# Altium footprint library LUMI_Handy_Soldering_LIB.PcbLib: 562 footprints (part 6 of 36)
Each footprint in its own frame and in the unit in brackets; x right, y up, seen from the top. Pads: shape width x height; smd on the part's side, far side on the other; paste and mask are expansions set on the pad; w line width, h text height; cw(c..) or ccw(c..) is an arc to the next point about the centre after c.
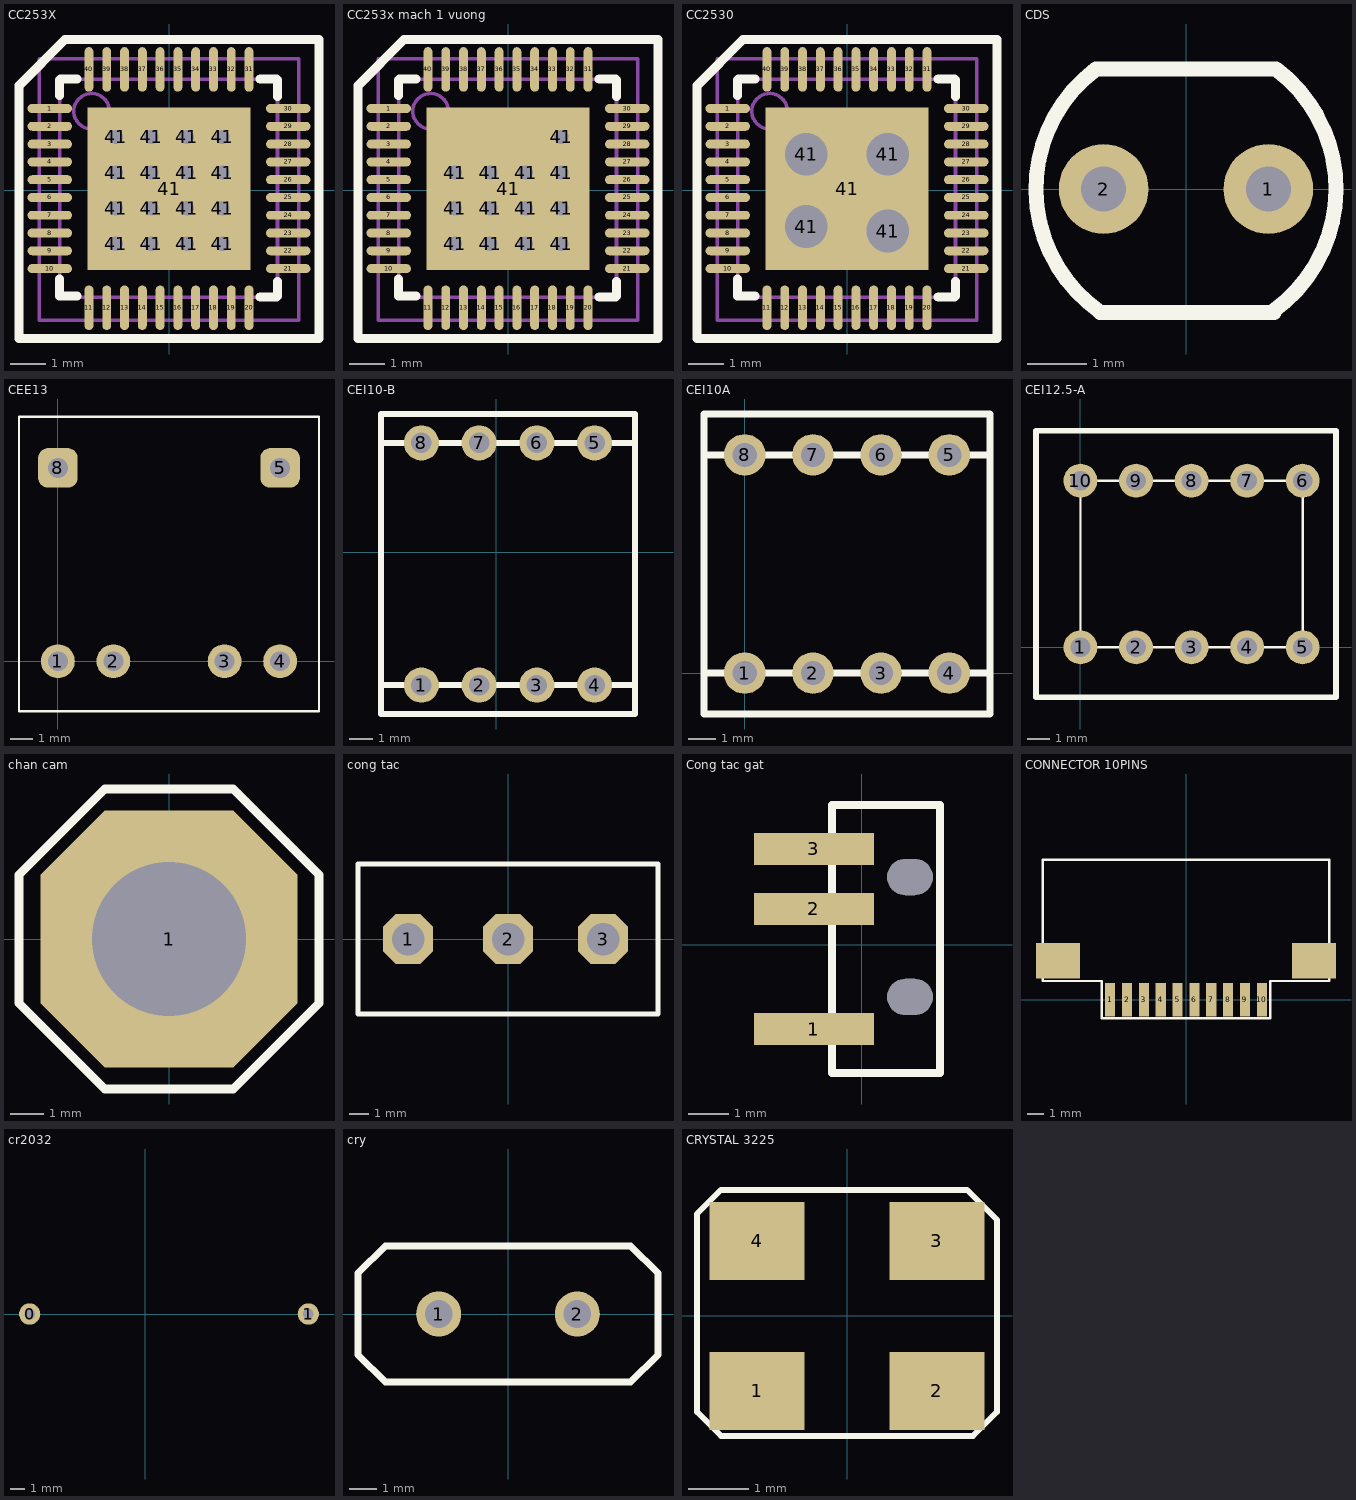
[diagram p5: the footprints below, top view; thin cyan lines are the x and y axes]

## CC253X [mm]
pads (57):
  oval 1.25x0.25 smd: 1(-3.35,2.3) 2(-3.35,1.8) 3(-3.35,1.3) 4(-3.35,0.8) 5(-3.35,0.3) 6(-3.35,-0.2) 7(-3.35,-0.7) 8(-3.35,-1.2) 9(-3.35,-1.7) 10(-3.35,-2.2) 21(3.35,-2.2) 22(3.35,-1.7) 23(3.35,-1.2) 24(3.35,-0.7) 25(3.35,-0.2) 26(3.35,0.3) 27(3.35,0.8) 28(3.35,1.3) 29(3.35,1.8) 30(3.35,2.3)
  oval 0.25x1.25 smd: 11(-2.25,-3.3) 12(-1.75,-3.3) 13(-1.25,-3.3) 14(-0.75,-3.3) 15(-0.25,-3.3) 16(0.25,-3.3) 17(0.75,-3.3) 18(1.25,-3.3) 19(1.75,-3.3) 20(2.25,-3.3) 31(2.25,3.4) 32(1.75,3.4) 33(1.25,3.4) 34(0.75,3.4) 35(0.25,3.4) 36(-0.25,3.4) 37(-0.75,3.4) 38(-1.25,3.4) 39(-1.75,3.4) 40(-2.25,3.4)
  round 0.8 hole 0.4: 41(-1.5,-1.5) 41(-1.5,-0.5) 41(-1.5,0.5) 41(-1.5,1.5) 41(-0.5,-1.5) 41(-0.5,-0.5) 41(-0.5,0.5) 41(-0.5,1.5) 41(0.5,-1.5) 41(0.5,-0.5) 41(0.5,0.5) 41(0.5,1.5) 41(1.5,-1.5) 41(1.5,-0.5) 41(1.5,0.5) 41(1.5,1.5)
  rect 4.572x4.572 smd: 41(0,0.05)
Top Overlay:
  lines w0.254: -3.073,-2.489 -3.073,-2.972 -2.591,-2.972 ; -3.073,2.667 -3.073,3.099 -3.048,3.124 -2.591,3.124 ; 2.565,-2.997 3.023,-2.997 3.048,-2.972 3.048,-2.565 ; 2.565,3.124 3.023,3.124 3.048,3.099 3.048,2.642 ; -4.216,-4.166 4.216,-4.166 4.216,4.242 -2.921,4.242 -4.216,2.946 -4.216,-4.166
Mechanical 13:
  circle w0.1: c-2.175,2.225 r0.5
  lines w0.1: -3.075,-3 3.05,-3 3.05,3.125 -3.075,3.125 -3.075,-3
Mechanical 15:
  lines w0.1: 0,-0.45 1,-0.45 ; 0.5,-0.95 0.5,0.05 ; -3.65,-3.65 3.65,-3.65 3.65,3.7 -3.65,3.7 -3.65,-3.65
3D body: height 1.04, standoff -0.01, extent -3.075,-3.025 3.075,3.125

## CC253x mach 1 vuong [mm]
pads (54):
  oval 1.25x0.25 smd: 1(-3.35,2.3) 2(-3.35,1.8) 3(-3.35,1.3) 4(-3.35,0.8) 5(-3.35,0.3) 6(-3.35,-0.2) 7(-3.35,-0.7) 8(-3.35,-1.2) 9(-3.35,-1.7) 10(-3.35,-2.2) 21(3.35,-2.2) 22(3.35,-1.7) 23(3.35,-1.2) 24(3.35,-0.7) 25(3.35,-0.2) 26(3.35,0.3) 27(3.35,0.8) 28(3.35,1.3) 29(3.35,1.8) 30(3.35,2.3)
  oval 0.25x1.25 smd: 11(-2.25,-3.3) 12(-1.75,-3.3) 13(-1.25,-3.3) 14(-0.75,-3.3) 15(-0.25,-3.3) 16(0.25,-3.3) 17(0.75,-3.3) 18(1.25,-3.3) 19(1.75,-3.3) 20(2.25,-3.3) 31(2.25,3.4) 32(1.75,3.4) 33(1.25,3.4) 34(0.75,3.4) 35(0.25,3.4) 36(-0.25,3.4) 37(-0.75,3.4) 38(-1.25,3.4) 39(-1.75,3.4) 40(-2.25,3.4)
  round 0.8 hole 0.4: 41(-1.5,-1.5) 41(-1.5,-0.5) 41(-1.5,0.5) 41(-0.5,-1.5) 41(-0.5,-0.5) 41(-0.5,0.5) 41(0.5,-1.5) 41(0.5,-0.5) 41(0.5,0.5) 41(1.5,-1.5) 41(1.5,-0.5) 41(1.5,0.5) 41(1.5,1.5)
  rect 4.572x4.572 smd: 41(0,0.05)
Top Overlay:
  lines w0.254: -3.073,-2.489 -3.073,-2.972 -2.591,-2.972 ; -3.073,2.667 -3.073,3.099 -3.048,3.124 -2.591,3.124 ; 2.565,-2.997 3.023,-2.997 3.048,-2.972 3.048,-2.565 ; 2.565,3.124 3.023,3.124 3.048,3.099 3.048,2.642 ; -4.216,-4.166 -4.216,2.946 -2.921,4.242 4.216,4.242 4.216,-4.166 -4.216,-4.166
Mechanical 13:
  circle w0.1: c-2.175,2.225 r0.5
  lines w0.1: -3.075,-3 -3.075,3.125 3.05,3.125 3.05,-3 -3.075,-3
Mechanical 15:
  lines w0.1: 0,-0.45 1,-0.45 ; 0.5,-0.95 0.5,0.05 ; -3.65,-3.65 -3.65,3.7 3.65,3.7 3.65,-3.65 -3.65,-3.65
3D body: height 1.04, standoff -0.01, extent -3.075,-3.025 3.075,3.125

## CC2530 [mm]
pads (45):
  oval 1.25x0.25 smd: 1(-3.35,2.3) 2(-3.35,1.8) 3(-3.35,1.3) 4(-3.35,0.8) 5(-3.35,0.3) 6(-3.35,-0.2) 7(-3.35,-0.7) 8(-3.35,-1.2) 9(-3.35,-1.7) 10(-3.35,-2.2) 21(3.35,-2.2) 22(3.35,-1.7) 23(3.35,-1.2) 24(3.35,-0.7) 25(3.35,-0.2) 26(3.35,0.3) 27(3.35,0.8) 28(3.35,1.3) 29(3.35,1.8) 30(3.35,2.3)
  oval 0.25x1.25 smd: 11(-2.25,-3.3) 12(-1.75,-3.3) 13(-1.25,-3.3) 14(-0.75,-3.3) 15(-0.25,-3.3) 16(0.25,-3.3) 17(0.75,-3.3) 18(1.25,-3.3) 19(1.75,-3.3) 20(2.25,-3.3) 31(2.25,3.4) 32(1.75,3.4) 33(1.25,3.4) 34(0.75,3.4) 35(0.25,3.4) 36(-0.25,3.4) 37(-0.75,3.4) 38(-1.25,3.4) 39(-1.75,3.4) 40(-2.25,3.4)
  round 1.6 hole 1.2: 41(-1.143,-1.016) 41(-1.143,1.016) 41(1.143,-1.143) 41(1.143,1.016)
  rect 4.572x4.572 smd: 41(0,0.05)
Top Overlay:
  lines w0.254: -3.073,-2.489 -3.073,-2.972 -2.591,-2.972 ; -3.073,2.667 -3.073,3.099 -3.048,3.124 -2.591,3.124 ; 2.565,-2.997 3.023,-2.997 3.048,-2.972 3.048,-2.565 ; 2.565,3.124 3.023,3.124 3.048,3.099 3.048,2.642 ; -4.216,-4.166 -4.216,2.946 -2.921,4.242 4.216,4.242 4.216,-4.166 -4.216,-4.166
Mechanical 13:
  circle w0.1: c-2.175,2.225 r0.5
  lines w0.1: -3.075,-3 -3.075,3.125 3.05,3.125 3.05,-3 -3.075,-3
Mechanical 15:
  lines w0.1: 0,-0.45 1,-0.45 ; 0.5,-0.95 0.5,0.05 ; -3.65,-3.65 -3.65,3.7 3.65,3.7 3.65,-3.65 -3.65,-3.65
3D body: height 1.04, standoff -0.01, extent -3.075,-3.025 3.075,3.125

## CDS [mil]
pads (2):
  round 60 hole 30: 1(55.12,0) 2(-55.12,0)
Top Overlay:
  lines w10: -57.56,-82.79 59.06,-82.79 ; -57.56,-82.23 cw(c0,0) -60.22,80.3 60.22,80.3 cw(c0,0) 58.29,-81.71
3D body: height 160, standoff -1330, extent -91,-75.26 91,78.74

## CEE13 [mil]
height 413.39
pads (6):
  round 60 hole 35: 1(0,0) 2(98.43,0) 3(295.28,0) 4(393.7,0)
  rrect50% 70x70 hole 35: 5(393.7,342.52) 8(0,342.52)
Top Overlay:
  lines w4: -68.9,-88.58 462.6,-88.58 462.6,433.07 -68.9,433.07 -68.9,-88.58
3D body: height 413.39, standoff 1, extent -196.85,-275.59 236.22,236.22
3D body: height 472.44, standoff 10, extent -68.9,-88.58 462.6,433.07
3D body: height 196.85, standoff -196.85, extent 378.82,-14.96 408.7,14.98
3D body: height 196.85, standoff -196.85, extent 280.4,-14.96 310.28,14.98
3D body: height 196.85, standoff -196.85, extent 83.55,-14.96 113.43,14.98
3D body: height 196.85, standoff -196.85, extent -14.88,-14.96 15,14.98
3D body: height 196.85, standoff -196.85, extent -14.88,327.56 15,357.5
3D body: height 196.85, standoff -196.85, extent 378.82,327.56 408.7,357.5

## CEI10-B [mil]
height 413.39
pads (8):
  round 60 hole 35: 1(-127.95,-226.38) 2(-29.53,-226.38) 3(68.9,-226.38) 4(167.32,-226.38) 5(167.32,187.01) 6(68.9,187.01) 7(-29.53,187.01) 8(-127.95,187.01)
Top Overlay:
  lines w10: -196.85,-226.38 236.22,-226.38 ; -196.85,187.01 236.22,187.01 ; -196.85,-275.59 -196.85,236.22 236.22,236.22 236.22,-275.59 -196.85,-275.59
3D body: height 413.39, standoff 1, extent -196.85,-275.59 236.22,236.22
3D body: height 413.39, standoff 10, extent -196.85,-275.59 236.22,236.22
3D body: height 196.85, standoff -196.85, extent -142.83,172.04 -112.95,201.98
3D body: height 196.85, standoff -196.85, extent -44.4,172.04 -14.52,201.98
3D body: height 196.85, standoff -196.85, extent 54.02,172.04 83.9,201.98
3D body: height 196.85, standoff -196.85, extent 152.45,172.04 182.33,201.98
3D body: height 196.85, standoff -196.85, extent -142.83,-241.34 -112.95,-211.4
3D body: height 196.85, standoff -196.85, extent -44.4,-241.34 -14.52,-211.4
3D body: height 196.85, standoff -196.85, extent 54.02,-241.34 83.9,-211.4
3D body: height 196.85, standoff -196.85, extent 152.45,-241.34 182.33,-211.4

## CEI10A [mil]
height 413.39
pads (8):
  round 60 hole 35: 1(0,0) 2(98.43,0) 3(196.85,0) 4(295.28,0) 5(295.28,314.96) 6(196.85,314.96) 7(98.43,314.96) 8(0,314.96)
Top Overlay:
  lines w10: -59.06,0 354.33,0 ; -59.06,314.96 354.33,314.96 ; -59.06,-59.06 354.33,-59.06 354.33,374.02 -59.06,374.02 -59.06,-59.06
3D body: height 196.85, standoff -196.85, extent 280.4,-14.96 310.28,14.97
3D body: height 196.85, standoff -196.85, extent 181.97,-14.96 211.85,14.97
3D body: height 196.85, standoff -196.85, extent 83.55,-14.96 113.43,14.97
3D body: height 196.85, standoff -196.85, extent -14.88,-14.96 15,14.97
3D body: height 196.85, standoff -196.85, extent 280.4,300 310.28,329.93
3D body: height 196.85, standoff -196.85, extent 181.97,300 211.86,329.94
3D body: height 196.85, standoff -196.85, extent 83.55,300 113.43,329.94
3D body: height 196.85, standoff -196.85, extent -14.88,300 15,329.94
3D body: height 433.07, standoff 7.87, extent -59.06,-59.06 354.33,374.02
3D body: height 413.39, standoff 1, extent -196.85,-275.59 236.22,236.22

## CEI12.5-A [mil]
height 413.39
pads (10):
  round 60 hole 35: 1(0,0) 2(98.43,0) 3(196.85,0) 4(295.28,0) 5(393.7,0) 6(393.7,295.28) 7(295.28,295.28) 8(196.85,295.28) 9(98.43,295.28) 10(0,295.28)
Top Overlay:
  lines w4: 0,0 393.7,0 393.7,295.28 0,295.28 0,0
  lines w10: -78.74,-88.58 -78.74,383.86 452.76,383.86 452.76,-88.58 -78.74,-88.58
3D body: height 413.39, standoff 1, extent -196.85,-275.59 236.22,236.22
3D body: height 413.39, standoff 10, extent -78.74,-88.58 452.76,383.86
3D body: height 196.85, standoff -196.85, extent -14.88,280.31 15,310.25
3D body: height 196.85, standoff -196.85, extent 83.55,280.31 113.43,310.25
3D body: height 196.85, standoff -196.85, extent 181.97,280.31 211.85,310.25
3D body: height 196.85, standoff -196.85, extent 280.4,280.31 310.28,310.25
3D body: height 196.85, standoff -196.85, extent 378.82,280.31 408.7,310.25
3D body: height 196.85, standoff -196.85, extent 378.82,-14.96 408.7,14.98
3D body: height 196.85, standoff -196.85, extent 280.4,-14.96 310.28,14.98
3D body: height 196.85, standoff -196.85, extent 181.97,-14.96 211.85,14.98
3D body: height 196.85, standoff -196.85, extent 83.55,-14.96 113.43,14.98
3D body: height 196.85, standoff -196.85, extent -14.88,-14.96 15,14.98

## chan cam [mil]
pads (1):
  oct 300x300 hole 180: 1(0,0)
Top Overlay:
  lines w10: -175,-75 -75,-175 75,-175 175,-75 175,75 75,175 -75,175 -175,75 -175,-75

## CHAN CAM 2 [mm]

## cong tac [mil]
pads (3):
  oct 100x100 hole 65: 1(-200,0) 2(0,0) 3(190,0)
Top Overlay:
  lines w10: -300,-150 300,-150 300,150 -300,150 -300,-150

## Cong tac gat [mm]
pads (5):
  rect 3x0.8 smd: 1(-1.2,-2.1) 2(-1.2,0.9) 3(-1.2,2.4)
  round 0 hole 0.9 slot 1.143 at 0 deg: ""(1.2,-1.3) ""(1.2,1.7)
Top Overlay:
  lines w0.2: -0.75,-3.2 -0.75,3.5 1.95,3.5 1.95,-3.2 -0.75,-3.2

## CONNECTOR 10PINS [mm] "Dung noi mach cam ung va mach cong suat"
pads (12):
  rect 0.6x2 smd: 1(-4.5,0) 2(-3.5,0) 3(-2.5,0) 4(-1.5,0) 5(-0.5,0) 6(0.5,0) 7(1.5,0) 8(2.5,0) 9(3.5,0) 10(4.5,0)
  rect 2.6x2.1 smd: ""(-7.6,2.3) ""(7.6,2.3)
Top Overlay:
  lines w0.127: -8.5,1.1 -5,1.1 -5,-1.1 5,-1.1 5,1.1 8.5,1.1 8.5,8.3 -8.5,8.3 -8.5,1.1
3D body: height 3, standoff 0, extent -8.5,-0.5 8.5,8.2

## cr2032 [mil]
pads (2):
  round 60 hole 30: 0(-325,0) 1(460,0)
3D body: height 307.94, standoff -111.35, extent -432.93,-444.07 492.27,445.69

## cry [mil]
pads (2):
  round 65 hole 40: 1(-100,0) 2(100,0)
Top Overlay:
  lines w10: -216.54,-59.06 -216.54,59.06 -177.17,98.43 177.17,98.43 216.54,59.06 216.54,-59.06 177.17,-98.43 -177.17,-98.43 -216.54,-59.06
3D body: height 145.67, standoff -149.61, extent -223.43,-93.07 223.43,90

## CRYSTAL 3225 [mm]
pads (4):
  rect 1.576x1.3 smd: 1(-1.5,-1.25) 2(1.5,-1.25) 3(1.5,1.25) 4(-1.5,1.25)
Top Overlay:
  lines w0.1: -2.5,-1.6 -2.5,1.7 -2.1,2.1 2,2.1 2.5,1.6 2.5,-1.6 2.1,-2 -2.1,-2 -2.5,-1.6
3D body: height 0.81, standoff 0, extent -1.6,-1.25 1.6,1.25